# Altium footprint library TEP_243-Altium_Library.PcbLib: 111 footprints (part 5 of 7)
Each footprint in its own frame and in the unit in brackets; x right, y up, seen from the top. Pads: shape width x height; smd on the part's side, far side on the other; paste and mask are expansions set on the pad; w line width, h text height; cw(c..) or ccw(c..) is an arc to the next point about the centre after c.
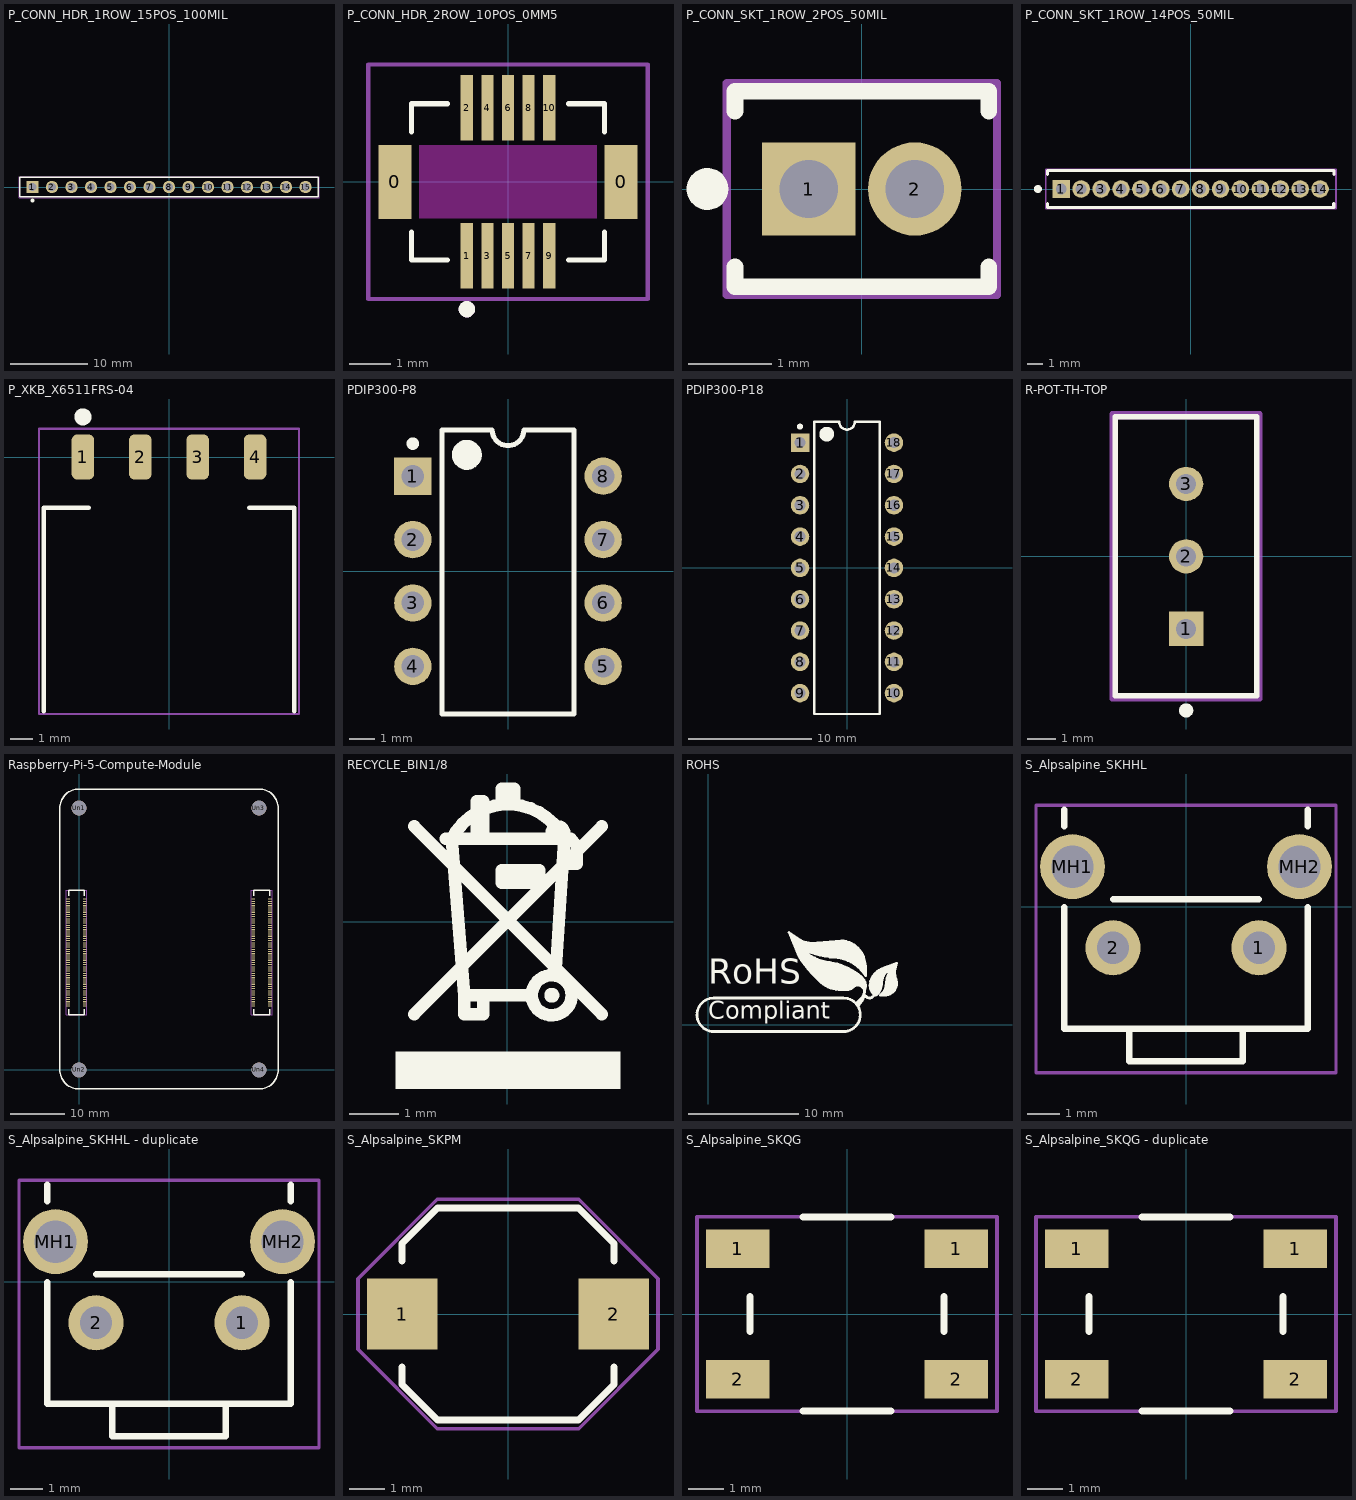
[diagram p4: the footprints below, top view; thin cyan lines are the x and y axes]

## P_CONN_HDR_1ROW_15POS_100MIL [mm] "2.54mm Single Row 15Pin, TH, Female Headers"
pads (15):
  rect 1.59x1.59 hole 1.04 paste-2539.97 mask+0: 1(-17.78,0)
  round 1.59 hole 1.04 paste-2539.97 mask+0: 2(-15.24,0) 3(-12.7,0) 4(-10.16,0) 5(-7.62,0) 6(-5.08,0) 7(-2.54,0) 8(0,0) 9(2.54,0) 10(5.08,0) 11(7.62,0) 12(10.16,0) 13(12.7,0) 14(15.24,0) 15(17.78,0)
Top Overlay:
  circle w0.25: c-17.78,-1.75 r0.125
  lines w0.2: -19.43,-1.27 -19.43,1.27 19.43,1.27 19.43,-1.27 -19.43,-1.27
Top Courtyard:
  lines w0.1: -19.53,-1.37 -19.53,1.37 19.53,1.37 19.53,-1.37 -19.53,-1.37
Top Designator:
  text ".Designator" at -2.878,-0.214 h1.5
3D body "Conn_Samtec_SSW-115-01-T-S_eec.STEP": height 0.25, standoff 0, extent -19.53,-1.37 19.53,1.37

## P_CONN_HDR_2ROW_10POS_0MM5 [mm] "CONN HIROSE DF12NB"
pads (12):
  rect 0.8x1.8 smd: 0(-2.75,0) 0(2.75,0)
  rect 0.3x1.6 smd paste-2 mask+0.05: 1(-1,-1.8) 2(-1,1.8) 3(-0.5,-1.8) 4(-0.5,1.8) 5(0,-1.8) 6(0,1.8) 7(0.5,-1.8) 8(0.5,1.8) 9(1,-1.8) 10(1,1.8)
Top Layer keep-out:
  region: 2.159,-0.889 -2.159,-0.889 -2.159,0.889 2.159,0.889
Top Overlay:
  circle w0.2: c-1,-3.1 r0.1
  lines w0.127: -2.35,-1.22 -2.35,-1.9 -1.47,-1.9 ; -2.35,1.22 -2.35,1.9 -1.47,1.9 ; 1.47,-1.9 2.35,-1.9 2.35,-1.22 ; 1.47,1.9 2.35,1.9 2.35,1.22
Top Paste:
  region: 0.14,1.4 -0.14,1.4 -0.14,2.6 0.14,2.6
  region: 0.64,1.4 0.36,1.4 0.36,2.6 0.64,2.6
  region: 1.14,1.4 0.86,1.4 0.86,2.6 1.14,2.6
  region: -0.36,1.4 -0.64,1.4 -0.64,2.6 -0.36,2.6
  region: -0.86,1.4 -1.14,1.4 -1.14,2.6 -0.86,2.6
  region: 0.14,-2.6 -0.14,-2.6 -0.14,-1.4 0.14,-1.4
  region: 0.64,-2.6 0.36,-2.6 0.36,-1.4 0.64,-1.4
  region: 1.14,-2.6 0.86,-2.6 0.86,-1.4 1.14,-1.4
  region: -0.36,-2.6 -0.64,-2.6 -0.64,-1.4 -0.36,-1.4
  region: -0.86,-2.6 -1.14,-2.6 -1.14,-1.4 -0.86,-1.4
Top Courtyard:
  lines w0.1: -3.4,-2.85 -3.4,2.85 3.4,2.85 3.4,-2.85 -3.4,-2.85
Top Designator:
  text ".Designator" at 0,0.188 h1
Top 3D Body:
  circle w0.2: c-1,-3.1 r0.1
3D body "DF12NB(3.0)-10DP-0.5V(51).STEP": height 2.3, standoff 0, extent -2.8,-2.35 2.8,2.25

## P_CONN_SKT_1ROW_2POS_50MIL [mm]
height 8.58
pads (2):
  rect 1.12x1.12 hole 0.7 paste-2539.97 mask+0: 1(-0.635,0)
  round 1.12 hole 0.7 paste-2539.97 mask+0: 2(0.635,0)
Top Overlay:
  circle w0.25: c-1.85,0 r0.125
  lines w0.2: -1.52,-0.935 -1.52,-1.17 1.52,-1.17 1.52,-0.935 ; -1.52,0.935 -1.52,1.17 1.52,1.17 1.52,0.935
Top Courtyard:
  lines w0.1: -1.62,-1.27 1.62,-1.27 1.62,1.27 -1.62,1.27 -1.62,-1.27
Top Designator:
  text ".Designator" at 0,0.188 h1
3D body "SLM-102-01-G-S.stp": height 4.57, standoff -2.92, extent -1.384,-1.27 1.384,1.27

## P_CONN_SKT_1ROW_14POS_50MIL [mm]
height 8.58
pads (14):
  rect 1.12x1.12 hole 0.7 paste-2539.97 mask+0: 1(-8.255,0)
  round 1.12 hole 0.7 paste-2539.97 mask+0: 2(-6.985,0) 3(-5.715,0) 4(-4.445,0) 5(-3.175,0) 6(-1.905,0) 7(-0.635,0) 8(0.635,0) 9(1.905,0) 10(3.175,0) 11(4.445,0) 12(5.715,0) 13(6.985,0) 14(8.255,0)
Top Overlay:
  circle w0.25: c-9.74,0 r0.125
  lines w0.2: -9.14,-0.935 -9.14,-1.17 9.123,-1.17 9.123,-0.935 ; -9.14,0.935 -9.14,1.17 9.137,1.17 9.137,0.935
Top Courtyard:
  lines w0.1: -9.24,-1.27 9.27,-1.27 9.27,1.27 -9.24,1.27 -9.24,-1.27
Top Designator:
  text ".Designator" at -2.25,0.25 h1
3D body "SLM-114-01-G-S.stp": height 4.57, standoff -2.92, extent -9.004,-1.27 9.004,1.27

## P_XKB_X6511FRS-04 [mm] "2.54mm Single Row 4Pin, Surface Mount, Right Angle Female Headers, 8.5mm"
pads (4):
  rrect50% 1x2 smd mask+0: 1(-3.81,0) 2(-1.27,0) 3(1.27,0) 4(3.81,0)
Top Overlay:
  circle w0.5: c-3.81,1.778 r0.127
  lines w0.2: -5.55,-11.25 -5.55,-2.25 -3.55,-2.25 ; 3.55,-2.25 5.55,-2.25 5.55,-11.25
Top Courtyard:
  lines w0.1: -5.75,-11.375 -5.75,1.25 5.75,1.25 5.75,-11.375 -5.75,-11.375
Top Designator:
  text ".Designator" at -3.114,-3.837 h1.5
3D body "M20-7910442_asm.stp": height 2.5, standoff 0, extent -5.205,-11.25 5.205,0.648

## PDIP300-P8 [mm] "8-Pin Plastic Dual In-Line Package (PDIP)"
height 5.34
pads (8):
  rect 1.5x1.5 hole 0.9: 1(-3.81,3.81)
  round 1.5 hole 0.9: 2(-3.81,1.27) 3(-3.81,-1.27) 4(-3.81,-3.81) 5(3.81,-3.81) 6(3.81,-1.27) 7(3.81,1.27) 8(3.81,3.81)
Top Overlay:
  circle w0.25: c-3.81,5.11 r0.125
  circle w0.6: c-1.65,4.662 r0.3
  lines w0.2: -2.65,-5.715 2.65,-5.715 2.65,5.662 0.635,5.662 cw(c0,5.662) -0.635,5.662 -2.65,5.662 -2.65,-5.715
Top Designator:
  text ".Designator" at -1.27,-0.255 h1
3D body "CircuitWorks-DIP8.STEP": height 4.19, standoff -2.67, extent -3.937,-5.715 3.937,5.715

## PDIP300-P18 [mm] "DIP, 18-Pin, Row Spacing 7.62 mm, Pitch 2.54 mm"
height 5.34
pads (18):
  rect 1.5x1.5 hole 0.9: 1(-3.81,10.16)
  round 1.5 hole 0.9: 2(-3.81,7.62) 3(-3.81,5.08) 4(-3.81,2.54) 5(-3.81,0) 6(-3.81,-2.54) 7(-3.81,-5.08) 8(-3.81,-7.62) 9(-3.81,-10.16) 10(3.81,-10.16) 11(3.81,-7.62) 12(3.81,-5.08) 13(3.81,-2.54) 14(3.81,0) 15(3.81,2.54) 16(3.81,5.08) 17(3.81,7.62) 18(3.81,10.16)
Top Overlay:
  circle w0.25: c-3.81,11.46 r0.125
  circle w0.6: c-1.65,10.85 r0.3
  lines w0.2: -2.65,-11.85 -2.65,11.85 -0.635,11.85 ccw(c0,11.85) 0.635,11.85 2.65,11.85 2.65,-11.85 -2.65,-11.85
Top Designator:
  text ".Designator" at -1.016,-0.255 h1
3D body "User Library-DIP-18P-M02.STEP": height 5, standoff -3, extent -4.06,-11 3.81,11

## R-POT-TH-TOP [mm]
pads (3):
  rect 1.2x1.2 hole 0.7 paste-2539.97 mask+0: 1(0.005,-2.54)
  round 1.2 hole 0.7 paste-2539.97 mask+0: 2(0.005,0) 3(0.005,2.54)
Top Overlay:
  circle w0.25: c0.005,-5.4 r0.125
  lines w0.2: -2.48,-4.89 -2.48,4.89 2.48,4.89 2.48,-4.89 -2.48,-4.89
Top Component Center:
  lines w0.1: -0.5,0 0.5,0 ; 0,-0.5 0,0.5
Top Courtyard:
  lines w0.15: -2.58,-4.99 -2.58,4.99 2.58,4.99 2.58,-4.99 -2.58,-4.99
Top Designator:
  text ".Designator" at 0,-0.001 h1
Top 3D Body:
  lines w0.2: -2.48,-4.89 -2.48,4.89 2.48,4.89 2.48,-4.89 -2.48,-4.89
Top Component Outline:
  lines w0.2: -2.58,-4.99 -2.58,4.99 2.58,4.99 2.58,-4.99 -2.58,-4.99
3D body "Res_Bourns_3296W-1-501RLF_eec.STEP": height 0.25, standoff 0, extent -2.58,-4.99 2.58,4.99

## Raspberry-Pi-5-Compute-Module [mm]
height 2.65
pads (204):
  rect 0.7x0.2 smd mask+0: 1(-2.04,31.3) 2(1.04,31.3) 3(-2.04,30.9) 4(1.04,30.9) 5(-2.04,30.5) 6(1.04,30.5) 7(-2.04,30.1) 8(1.04,30.1) 9(-2.04,29.7) 10(1.04,29.7) 11(-2.04,29.3) 12(1.04,29.3) 13(-2.04,28.9) 14(1.04,28.9) 15(-2.04,28.5) 16(1.04,28.5) 17(-2.04,28.1) 18(1.04,28.1) 19(-2.04,27.7) 20(1.04,27.7) 21(-2.04,27.3) 22(1.04,27.3) 23(-2.04,26.9) 24(1.04,26.9) 25(-2.04,26.5) 26(1.04,26.5) 27(-2.04,26.1) 28(1.04,26.1) 29(-2.04,25.7) 30(1.04,25.7) 31(-2.04,25.3) 32(1.04,25.3) 33(-2.04,24.9) 34(1.04,24.9) 35(-2.04,24.5) 36(1.04,24.5) 37(-2.04,24.1) 38(1.04,24.1) 39(-2.04,23.7) 40(1.04,23.7) 41(-2.04,23.3) 42(1.04,23.3) 43(-2.04,22.9) 44(1.04,22.9) 45(-2.04,22.5) 46(1.04,22.5) 47(-2.04,22.1) 48(1.04,22.1) 49(-2.04,21.7) 50(1.04,21.7) 51(-2.04,21.3) 52(1.04,21.3) 53(-2.04,20.9) 54(1.04,20.9) 55(-2.04,20.5) 56(1.04,20.5) 57(-2.04,20.1) 58(1.04,20.1) 59(-2.04,19.7) 60(1.04,19.7) 61(-2.04,19.3) 62(1.04,19.3) 63(-2.04,18.9) 64(1.04,18.9) 65(-2.04,18.5) 66(1.04,18.5) 67(-2.04,18.1) 68(1.04,18.1) 69(-2.04,17.7) 70(1.04,17.7) 71(-2.04,17.3) 72(1.04,17.3) 73(-2.04,16.9) 74(1.04,16.9) 75(-2.04,16.5) 76(1.04,16.5) 77(-2.04,16.1) 78(1.04,16.1) 79(-2.04,15.7) 80(1.04,15.7) 81(-2.04,15.3) 82(1.04,15.3) 83(-2.04,14.9) 84(1.04,14.9) 85(-2.04,14.5) 86(1.04,14.5) 87(-2.04,14.1) 88(1.04,14.1) 89(-2.04,13.7) 90(1.04,13.7) 91(-2.04,13.3) 92(1.04,13.3) 93(-2.04,12.9) 94(1.04,12.9) 95(-2.04,12.5) 96(1.04,12.5) 97(-2.04,12.1) 98(1.04,12.1) 99(-2.04,11.7) 100(1.04,11.7) 101(31.96,31.3) 102(35.04,31.3) 103(31.96,30.9) 104(35.04,30.9) 105(31.96,30.5) 106(35.04,30.5) 107(31.96,30.1) 108(35.04,30.1) 109(31.96,29.7) 110(35.04,29.7) 111(31.96,29.3) 112(35.04,29.3) 113(31.96,28.9) 114(35.04,28.9) 115(31.96,28.5) 116(35.04,28.5) 117(31.96,28.1) 118(35.04,28.1) 119(31.96,27.7) 120(35.04,27.7) 121(31.96,27.3) 122(35.04,27.3) 123(31.96,26.9) 124(35.04,26.9) 125(31.96,26.5) 126(35.04,26.5) 127(31.96,26.1) 128(35.04,26.1) 129(31.96,25.7) 130(35.04,25.7) 131(31.96,25.3) 132(35.04,25.3) 133(31.96,24.9) 134(35.04,24.9) 135(31.96,24.5) 136(35.04,24.5) 137(31.96,24.1) 138(35.04,24.1) 139(31.96,23.7) 140(35.04,23.7) 141(31.96,23.3) 142(35.04,23.3) 143(31.96,22.9) 144(35.04,22.9) 145(31.96,22.5) 146(35.04,22.5) 147(31.96,22.1) 148(35.04,22.1) 149(31.96,21.7) 150(35.04,21.7) 151(31.96,21.3) 152(35.04,21.3) 153(31.96,20.9) 154(35.04,20.9) 155(31.96,20.5) 156(35.04,20.5) 157(31.96,20.1) 158(35.04,20.1) 159(31.96,19.7) 160(35.04,19.7) 161(31.96,19.3) 162(35.04,19.3) 163(31.96,18.9) 164(35.04,18.9) 165(31.96,18.5) 166(35.04,18.5) 167(31.96,18.1) 168(35.04,18.1) 169(31.96,17.7) 170(35.04,17.7) 171(31.96,17.3) 172(35.04,17.3) 173(31.96,16.9) 174(35.04,16.9) 175(31.96,16.5) 176(35.04,16.5) 177(31.96,16.1) 178(35.04,16.1) 179(31.96,15.7) 180(35.04,15.7) 181(31.96,15.3) 182(35.04,15.3) 183(31.96,14.9) 184(35.04,14.9) 185(31.96,14.5) 186(35.04,14.5) 187(31.96,14.1) 188(35.04,14.1) 189(31.96,13.7) 190(35.04,13.7) 191(31.96,13.3) 192(35.04,13.3) 193(31.96,12.9) 194(35.04,12.9) 195(31.96,12.5) 196(35.04,12.5) 197(31.96,12.1) 198(35.04,12.1) 199(31.96,11.7) 200(35.04,11.7)
  round 2.7 hole 2.7 paste-2539.97 mask+1.7: Un1(0,48) Un2(0,0) Un3(33,48) Un4(33,0)
Top Overlay:
  lines w0.254: -1.86,11.1 -1.86,10.1 0.94,10.1 0.94,11.1 ; -1.86,31.9 -1.86,32.9 0.94,32.9 0.94,31.9 ; 32.06,11.1 32.06,10.1 34.94,10.1 34.94,11.1 ; 32.06,31.9 32.06,32.9 34.94,32.9 34.94,31.9 ; -3.5,0 ccw(c0,0) 0,-3.5 33,-3.5 ccw(c33,0) 36.5,0 36.5,48 ccw(c33,48) 33,51.5 0,51.5 ccw(c0,48) -3.5,48 -3.5,0
Top Courtyard:
  lines w0.1: -2.31,10.1 1.39,10.1 1.39,32.9 -2.31,32.9 -2.31,10.1 ; 31.61,10.1 31.61,32.9 35.39,32.9 35.39,10.1 31.61,10.1
3D body "CM5R5-3dsteps.step": height 6.51, standoff 1.89, extent -3.5,-3.5 36.5,51.5

## RECYCLE_BIN1/8 [mm] "RECYCLE_BIN1/8"
Top Overlay:
  circle w0.254: c0.9,-1.495 r0.025
  circle w0.254: c0.9,-1.495 r0.406
  circle w0.254: c1.027,1.807 r0.127
  rectangle: -2.275,-3.4 2.297,-2.638
  lines w0.254: -1.894,-1.876 1.154,1.172 ; -1.894,1.934 1.916,-1.876 ; -1.259,1.68 -1.132,1.68 ; 0.494,-1.495 -0.497,-1.495 ; 0.976,-1.089 1.154,1.68 ; 1.916,1.934 1.154,1.172 ; -1.132,1.68 cw(c0.011,1.109) 1.154,1.68 ; -1.132,1.68 -0.878,-1.495 ; -1.132,1.68 -0.624,1.68 ; -0.878,-1.495 -0.497,-1.495 ; -0.878,-1.495 -0.878,-1.876 -0.497,-1.876 -0.497,-1.495 ; -0.624,1.68 -0.497,1.68 ; -0.624,1.68 -0.624,2.442 -0.497,2.442 -0.497,1.68 ; -0.497,1.68 1.154,1.68 ; 1.154,1.172 1.408,1.172 1.408,1.553 1.281,1.68 1.154,1.68 ; -0.116,0.791 -0.116,1.045 0.646,1.045 0.646,0.791 -0.116,0.791 ; -0.116,2.442 -0.116,2.696 0.138,2.696 0.138,2.442 -0.116,2.442

## ROHS [mm] "ROHS"
Top Overlay:
  drawing of 188 lines, arcs and shapes, not listed
  text "Compliant" at 0,0 h2.76
  text "RoHS" at 0,2.921 h3.94

## S_Alpsalpine_SKHHL [mm]
pads (4):
  round 1.7 hole 1 paste-2539.97 mask+0: 1(2.25,-1.27) 2(-2.25,-1.27)
  round 2 hole 1.3 paste-2539.97 mask+0: MH1(-3.5,1.23) MH2(3.5,1.23)
Top Overlay:
  lines w0.2: -3.75,-0.02 -3.75,-3.77 3.75,-3.77 3.75,-0.02 ; -3.75,2.48 -3.75,2.98 ; -2.25,0.23 2.25,0.23 ; -1.75,-3.77 -1.75,-4.77 1.75,-4.77 1.75,-3.77 ; 3.75,2.48 3.75,2.98
Top Courtyard:
  lines w0.1: -4.625,-5.125 4.625,-5.125 4.625,3.125 -4.625,3.125 -4.625,-5.125
Top Designator:
  text ".Designator" at -2.489,-0.212 h1.5
3D body "skhhlna010.step": height 7.4, standoff -3.5, extent -4.25,-4.975 4.25,2.925

## S_Alpsalpine_SKHHL - duplicate [mm]
height 2.65
pads (4):
  round 1.7 hole 1 paste-2539.97 mask+0: 1(2.25,-1.27) 2(-2.25,-1.27)
  round 2 hole 1.3 paste-2539.97 mask+0: MH1(-3.5,1.23) MH2(3.5,1.23)
Top Overlay:
  lines w0.2: -3.75,-0.02 -3.75,-3.77 3.75,-3.77 3.75,-0.02 ; -3.75,2.48 -3.75,2.98 ; -2.25,0.23 2.25,0.23 ; -1.75,-3.77 -1.75,-4.77 1.75,-4.77 1.75,-3.77 ; 3.75,2.48 3.75,2.98
Top Courtyard:
  lines w0.1: -4.625,-5.125 4.625,-5.125 4.625,3.125 -4.625,3.125 -4.625,-5.125
Top Designator:
  text ".Designator" at -2.235,-0.212 h1.5
3D body "skhhlna010.step": height 7.4, standoff -3.5, extent -4.25,-4.975 4.25,2.925

## S_Alpsalpine_SKPM [mm]
pads (2):
  rect 2x2 smd mask+0: 1(-3,0) 2(3,0)
Top Overlay:
  lines w0.2: -3,-1.5 -3,-2 -2,-3 2,-3 3,-2 3,-1.5 ; -3,1.5 -3,2 -2,3 2,3 3,2 3,1.5
Top Courtyard:
  lines w0.1: -4.25,-1 -4.25,0 -4.25,1 -2,3.25 2,3.25 4.25,1 4.25,-1 2,-3.25 -2,-3.25 -4.25,-1
Top Designator:
  text ".Designator" at -2.489,-0.212 h1.5
3D body "skpmbhe010.step": height 5, standoff 0, extent -3.3,-2.97 3.3,2.97

## S_Alpsalpine_SKQG [mm]
height 2.65
pads (4):
  rect 1.8x1.1 smd mask+0: 1(-3.1,1.85) 1(3.1,1.85) 2(-3.1,-1.85) 2(3.1,-1.85)
Top Overlay:
  lines w0.2: -2.75,-0.5 -2.75,0.5 ; -1.25,-2.75 1.25,-2.75 ; -1.25,2.75 1.25,2.75 ; 2.75,-0.5 2.75,0.5
Top Courtyard:
  lines w0.1: -4.25,-2.75 4.25,-2.75 4.25,2.75 -4.25,2.75 -4.25,-2.75
Top Designator:
  text ".Designator" at -2.489,-0.212 h1.5
3D body "SKQGAF.STEP": height 1.5, standoff 0, extent -3.2,-2.6 3.2,2.6

## S_Alpsalpine_SKQG - duplicate [mm]
height 2.65
pads (4):
  rect 1.8x1.1 smd mask+0: 1(-3.1,1.85) 1(3.1,1.85) 2(-3.1,-1.85) 2(3.1,-1.85)
Top Overlay:
  lines w0.2: -2.75,-0.5 -2.75,0.5 ; -1.25,-2.75 1.25,-2.75 ; -1.25,2.75 1.25,2.75 ; 2.75,-0.5 2.75,0.5
Top Courtyard:
  lines w0.1: -4.25,-2.75 -4.25,2.75 4.25,2.75 4.25,-2.75 -4.25,-2.75
Top Designator:
  text ".Designator" at -2.489,-0.212 h1.5
3D body "SKQGAF.STEP": height 1.5, standoff 0, extent -3.2,-2.6 3.2,2.6